# Altium footprint library ICs And Semiconductors THD.PcbLib: 292 footprints (part 8 of 19)
Each footprint in its own frame and in the unit in brackets; x right, y up, seen from the top. Pads: shape width x height; smd on the part's side, far side on the other; paste and mask are expansions set on the pad; w line width, h text height; cw(c..) or ccw(c..) is an arc to the next point about the centre after c.
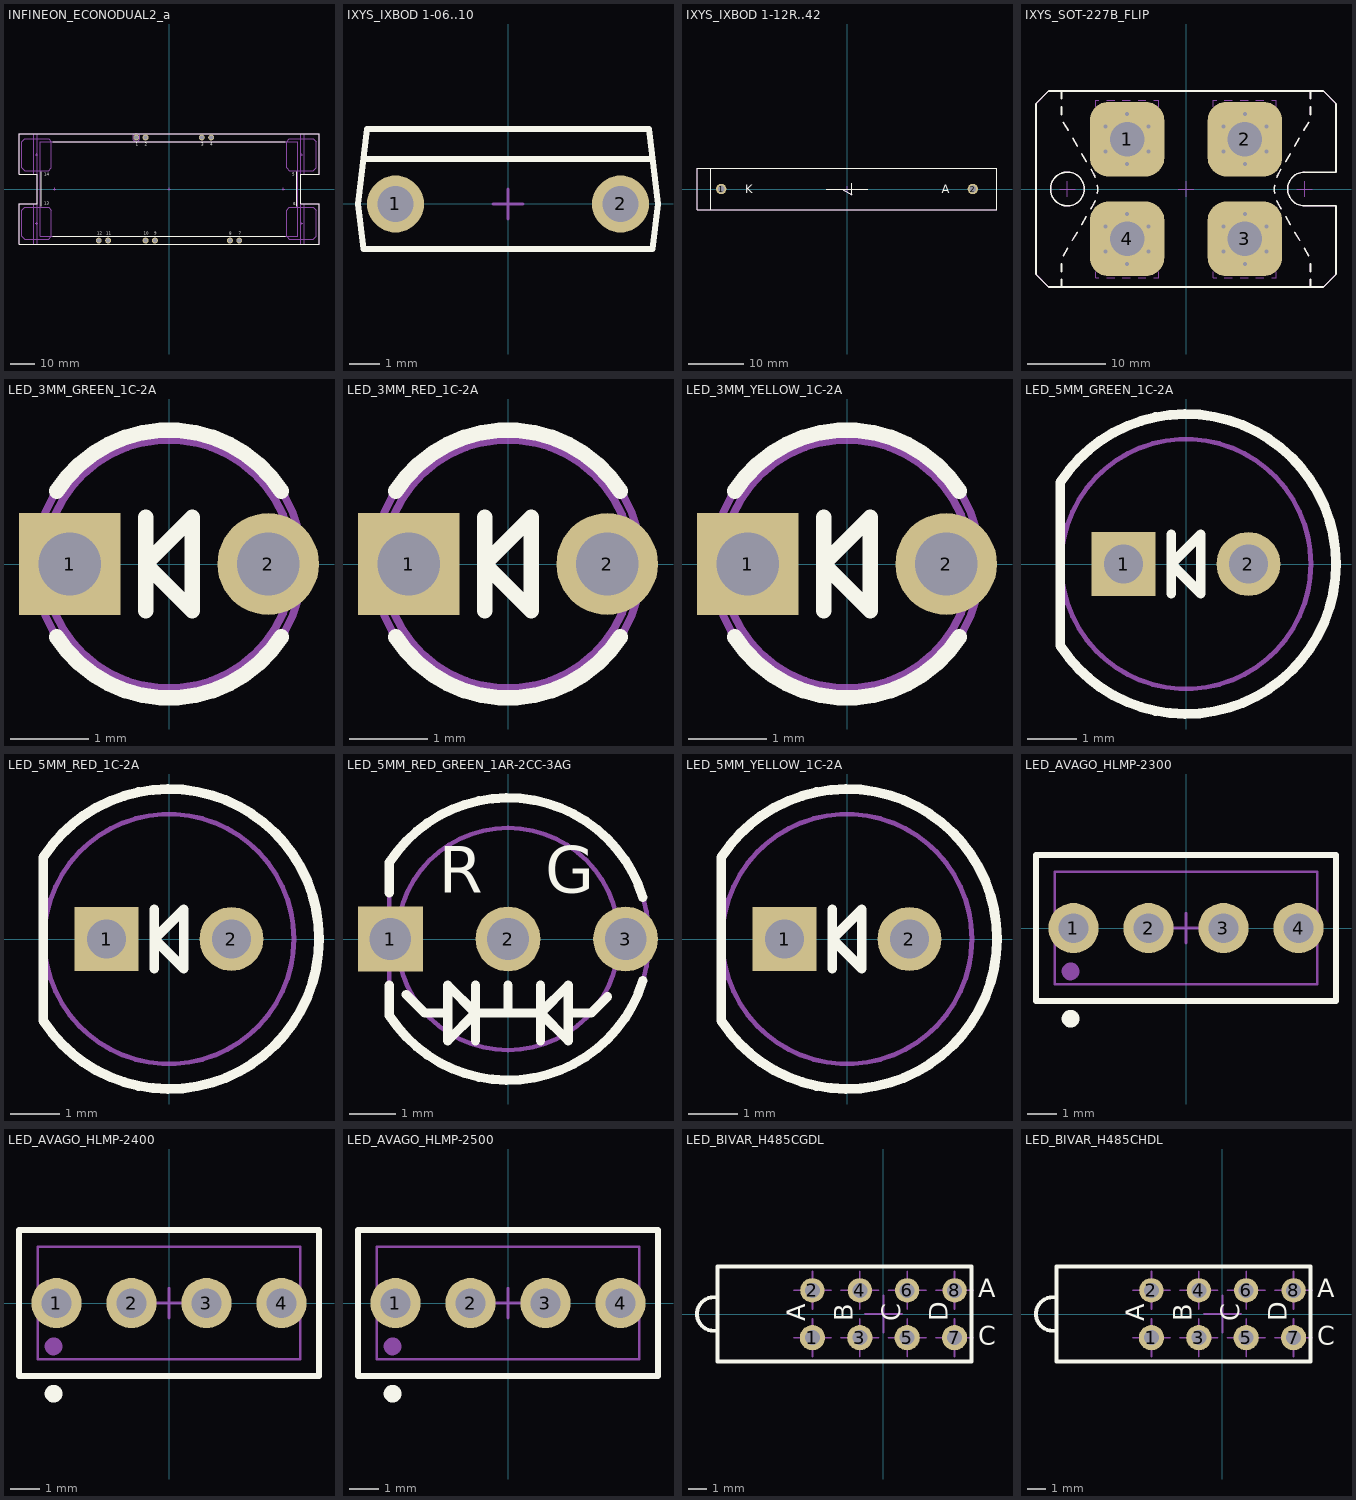
[diagram p7: the footprints below, top view; thin cyan lines are the x and y axes]

## INFINEON_ECONODUAL2_a [mm] "INFINEON EconoDUAL 2 Module"
height 17.5
pads (10):
  round 2.4 hole 1.7: 1(-13.33,20.95) 2(-9.52,20.95) 3(13.34,20.95) 4(17.15,20.95) 7(28.58,-20.95) 8(24.77,-20.95) 9(-5.71,-20.95) 10(-9.52,-20.95) 11(-24.76,-20.95) 12(-28.57,-20.95)
Top Overlay:
  lines w0.2: -52.025,-7 -52.025,7 ; -47.3,-19.15 47.3,-19.15 ; -47.3,19.15 47.3,19.15 ; 52.025,-7 52.025,7 ; -61,-22.5 -61,-6.028 -53.6,-6.028 -53.6,6.028 -61,6.028 -61,22.5 61,22.5 61,6.028 53.6,6.028 53.6,-6.028 61,-6.028 61,-22.5 -61,-22.5
  text "6" at 50.434,-6.7 h1.2
  text "5" at 50.134,5.4 h1.2
  text "14" at -50.78,5.45 h1.2
  text "13" at -50.78,-6.45 h1.2
  text "12" at -29.25,-18.6 h1.2
  text "11" at -25.44,-18.6 h1.2
  text "10" at -10.2,-18.6 h1.2
  text "9" at -5.99,-18.7 h1.2
  text "8" at 24.49,-18.7 h1.2
  text "7" at 28.3,-18.7 h1.2
  text "4" at 16.8,17.6 h1.2
  text "3" at 13.034,17.6 h1.2
  text "2" at -9.8,17.6 h1.2
  text "1" at -13.6,17.6 h1.2
Notvisible:
  circle w0.1: c-13.33,20.95 r1.5
  lines w0.1: -54.3,-14 -53.8,-14 ; -54.3,14 -53.8,14 ; -53.8,-14.5 -53.8,-14 ; -53.8,-13.5 -53.8,-14 ; -53.8,13.5 -53.8,14 ; -53.8,14.5 -53.8,14 ; -53.3,-14 -53.8,-14 ; -53.3,14 -53.8,14 ; -47,0 -46.5,0 ; -46.5,-0.5 -46.5,0 ; -46.5,0.5 -46.5,0 ; -46,0 -46.5,0 ; -29.07,-20.95 -28.57,-20.95 ; -28.57,-21.45 -28.57,-20.95 ; -28.57,-20.45 -28.57,-20.95 ; -28.07,-20.95 -28.57,-20.95 ; -25.26,-20.95 -24.76,-20.95 ; -24.76,-21.45 -24.76,-20.95 ; -24.76,-20.45 -24.76,-20.95 ; -24.26,-20.95 -24.76,-20.95 ; -13.83,20.95 -13.33,20.95 ; -13.33,20.45 -13.33,20.95 ; -13.33,21.45 -13.33,20.95 ; -12.83,20.95 -13.33,20.95 ; -10.02,-20.95 -9.52,-20.95 ; -10.02,20.95 -9.52,20.95 ; -9.52,-21.45 -9.52,-20.95 ; -9.52,-20.45 -9.52,-20.95 ; -9.52,20.45 -9.52,20.95 ; -9.52,21.45 -9.52,20.95 ; -9.02,-20.95 -9.52,-20.95 ; -9.02,20.95 -9.52,20.95 ; -6.21,-20.95 -5.71,-20.95 ; -5.71,-21.45 -5.71,-20.95 ; -5.71,-20.45 -5.71,-20.95 ; -5.21,-20.95 -5.71,-20.95 ; -0.5,0 0,0 ; 0,-0.5 0,0 ; 0,0.5 0,0 ; 0.5,0 0,0 ; 12.84,20.95 13.34,20.95 ; 13.34,20.45 13.34,20.95 ; 13.34,21.45 13.34,20.95 ; 13.84,20.95 13.34,20.95 ; 16.65,20.95 17.15,20.95 ; 17.15,20.45 17.15,20.95 ; 17.15,21.45 17.15,20.95 ; 17.65,20.95 17.15,20.95 ; 24.27,-20.95 24.77,-20.95 ; 24.77,-21.45 24.77,-20.95 ; 24.77,-20.45 24.77,-20.95 ; 25.27,-20.95 24.77,-20.95 ; 28.08,-20.95 28.58,-20.95 ; 28.58,-21.45 28.58,-20.95 ; 28.58,-20.45 28.58,-20.95 ; 29.08,-20.95 28.58,-20.95 ; 46,0 46.5,0 ; 46.5,-0.5 46.5,0 ; 46.5,0.5 46.5,0 ; 47,0 46.5,0 ; 53.3,-14 53.8,-14 ; 53.3,14 53.8,14 ; 53.8,-14.5 53.8,-14 ; 53.8,-13.5 53.8,-14 ; 53.8,13.5 53.8,14 ; 53.8,14.5 53.8,14 ; 54.3,-14 53.8,-14 ; 54.3,14 53.8,14 ; -59.8,-19.3 -58.6,-20.5 -49,-20.5 -47.8,-19.3 -47.8,-8.7 -49,-7.5 -58.6,-7.5 -59.8,-8.7 -59.8,-19.3 ; -59.8,8.7 -59.8,19.3 -58.6,20.5 -49,20.5 -47.8,19.3 -47.8,8.7 -49,7.5 -58.6,7.5 -59.8,8.7 ; 47.8,-19.3 47.8,-8.7 49,-7.5 58.6,-7.5 59.8,-8.7 59.8,-19.3 58.6,-20.5 49,-20.5 47.8,-19.3 ; 47.8,8.7 47.8,19.3 49,20.5 58.6,20.5 59.8,19.3 59.8,8.7 58.6,7.5 49,7.5 47.8,8.7
Mechanical 14:
  lines w0.1: -55.1,-22.5 -55.1,-6.028 ; -55.1,6.028 -55.1,22.5 ; -53.6,-22.5 -53.6,22.5 ; -53.6,-6.028 -61,-6.028 -61,-22.5 61,-22.5 61,-6.028 53.6,-6.028 ; -53.6,6.028 -61,6.028 -61,22.5 61,22.5 61,6.028 53.6,6.028 ; 53.6,-22.5 53.6,22.5 ; 55.1,-22.5 55.1,-6.028 ; 55.1,6.028 55.1,22.5 ; -52.4,-19.15 52.4,-19.15 52.4,19.15 -52.4,19.15 -52.4,-19.15
  text "6" at 50.434,-6.7 h1.2
  text "5" at 50.134,5.4 h1.2
  text "14" at -50.78,5.45 h1.2
  text "13" at -50.78,-6.45 h1.2
  text "12" at -29.25,-18.6 h1.2
  text "11" at -25.44,-18.6 h1.2
  text "10" at -10.2,-18.6 h1.2
  text "9" at -5.99,-18.7 h1.2
  text "8" at 24.49,-18.7 h1.2
  text "7" at 28.3,-18.7 h1.2
  text "4" at 16.8,17.6 h1.2
  text "3" at 13.034,17.6 h1.2
  text "2" at -9.8,17.6 h1.2
  text "1" at -13.6,17.6 h1.2
3D body "INFINEON_ECONODUAL2.stp": height 17, standoff -3.5, extent -61,-22.5 61,22.5

## IXYS_IXBOD 1-06..10 [mm] "Lead spacing 7.5mm Body 10mm X 4mm"
height 9
pads (2):
  round 1.9 hole 1.2: 1(-3.75,0) 2(3.75,0)
Top Overlay:
  lines w0.2: -4.816,1.5 4.816,1.5 ; -5,0 -4.816,-1.5 4.816,-1.5 5,0 4.693,2.5 -4.693,2.5 -5,0
Notvisible:
  lines w0.1: -4.25,0 -3.75,0 ; -3.75,-0.5 -3.75,0 ; -3.75,0.5 -3.75,0 ; -3.25,0 -3.75,0 ; -0.5,0 0,0 ; 0,-0.5 0,0 ; 0,0.5 0,0 ; 0.5,0 0,0 ; 3.25,0 3.75,0 ; 3.75,-0.5 3.75,0 ; 3.75,0.5 3.75,0 ; 4.25,0 3.75,0
Mechanical 14:
  lines w0.1: -4.816,1.5 4.816,1.5 ; -5,0 -4.816,-1.5 4.816,-1.5 5,0 4.693,2.5 -4.693,2.5 -5,0
3D body "IXYS_IXBOD 1-06..10.stp": height 9, standoff -4, extent -5,-1.5 5,2.5

## IXYS_IXBOD 1-12R..42 [mm] "Lead spacing 45.7mm Body 54.5mm X 7.5mm"
height 19
pads (2):
  round 1.9 hole 1.2: 1(-22.86,0) 2(22.86,0)
Top Overlay:
  lines w0.2: -24.75,-3.75 -24.75,3.75 ; -3.75,0 3.75,0 ; -0.866,0 0.866,-1 0.866,1 ; -27.25,-3.75 27.25,-3.75 27.25,3.75 -27.25,3.75 -27.25,-3.75
  text "K" at -18.454,-0.75 h1.5
  text "A" at 17.175,-0.75 h1.5
Notvisible:
  lines w0.1: -23.35,0 -22.85,0 ; -22.85,-0.5 -22.85,0 ; -22.85,0.5 -22.85,0 ; -22.35,0 -22.85,0 ; -0.5,0 0,0 ; 0,-0.5 0,0 ; 0,0.5 0,0 ; 0.5,0 0,0 ; 22.35,0 22.85,0 ; 22.85,-0.5 22.85,0 ; 22.85,0.5 22.85,0 ; 23.35,0 22.85,0
Mechanical 14:
  lines w0.1: -24.75,-3.75 -24.75,3.75 ; -3.75,0 3.75,0 ; -0.866,0 0.866,-1 0.866,1 ; -27.25,-3.75 27.25,-3.75 27.25,3.75 -27.25,3.75 -27.25,-3.75
  text "K" at -18.454,-0.75 h1.5
  text "A" at 17.175,-0.75 h1.5
3D body "IXYS_IXBOD 1-12..42.stp": height 19, standoff -3.1, extent -27.25,-3.75 27.25,3.75

## IXYS_SOT-227B_FLIP [mm] "IXYS SOT-227B (Minibloc) Case, Body 38.01mm x 25.42mm, Screws on PCB Version"
height 12.22
pads (4):
  rrect50% 9.5x9.5 hole 4.4: 1(-7.5,6.35) 2(7.5,6.35) 3(7.5,-6.35) 4(-7.5,-6.35)
via 10.25,4.763 diameter 1 hole 0.5
via 7.5,3.175 diameter 1 hole 0.5
via 4.75,4.763 diameter 1 hole 0.5
via 4.75,7.938 diameter 1 hole 0.5
via 7.5,9.525 diameter 1 hole 0.5
via 10.25,7.938 diameter 1 hole 0.5
via -4.75,4.763 diameter 1 hole 0.5
via -7.5,3.175 diameter 1 hole 0.5
via -10.25,4.763 diameter 1 hole 0.5
via -10.25,7.938 diameter 1 hole 0.5
via -7.5,9.525 diameter 1 hole 0.5
via -4.75,7.938 diameter 1 hole 0.5
via 10.25,-7.938 diameter 1 hole 0.5
via 7.5,-9.525 diameter 1 hole 0.5
via 4.75,-7.938 diameter 1 hole 0.5
via 4.75,-4.763 diameter 1 hole 0.5
via 7.5,-3.175 diameter 1 hole 0.5
via 10.25,-4.763 diameter 1 hole 0.5
via -4.75,-7.938 diameter 1 hole 0.5
via -7.5,-9.525 diameter 1 hole 0.5
via -10.25,-7.938 diameter 1 hole 0.5
via -10.25,-4.763 diameter 1 hole 0.5
via -7.5,-3.175 diameter 1 hole 0.5
via -4.75,-4.763 diameter 1 hole 0.5
Top Overlay:
  circle w0.2: c-15.1,0 r2.15
  lines w0.2: -15.85,-11.521 -15.85,-12.479 ; -15.85,-10.521 -15.85,-9.521 ; -15.85,9.479 -15.85,10.479 ; -15.85,11.479 -15.85,12.479 ; -15.628,-8.521 -15.043,-7.521 ; -15.603,8.479 -15.018,7.479 ; -14.457,-6.521 -13.871,-5.521 ; -14.432,6.479 -13.847,5.479 ; -13.286,-4.521 -12.7,-3.521 ; -13.261,4.479 -12.676,3.479 ; -12.115,-2.521 -11.778,-1.945 ccw(c-15.1,0) -11.563,-1.521 ; -12.09,2.479 -11.778,1.945 cw(c-15.1,0) -11.545,1.479 ; -11.285,-0.521 ccw(c-15.1,0) -11.28,0.479 ; 11.28,0.479 ccw(c15.1,0) 11.285,-0.521 ; 11.545,1.479 cw(c15.1,0) 11.778,1.945 12.09,2.479 ; 11.563,-1.521 ccw(c15.1,0) 11.778,-1.945 12.115,-2.521 ; 12.676,3.479 13.261,4.479 ; 12.7,-3.521 13.286,-4.521 ; 13.847,5.479 14.432,6.479 ; 13.871,-5.521 14.457,-6.521 ; 15.018,7.479 15.603,8.479 ; 15.043,-7.521 15.628,-8.521 ; 15.85,-11.521 15.85,-12.479 ; 15.85,-10.521 15.85,-9.521 ; 15.85,9.479 15.85,10.479 ; 15.85,11.479 15.85,12.479 ; -15.85,-12.479 15.85,-12.479 ; -15.85,-12.479 -17.5,-12.479 -19.1,-10.879 -19.1,10.879 -17.5,12.479 -15.85,12.479 ; -15.85,12.479 15.85,12.479 ; 15.1,-2.15 cw(c15.1,0) 15.1,2.15 ; 15.1,-2.15 19.1,-2.15 ; 15.1,-2.15 19.1,-2.15 ; 15.1,2.15 19.1,2.15 ; 15.1,2.15 19.1,2.15 ; 15.85,-12.479 17.5,-12.479 19.1,-10.879 19.1,-2.15 ; 15.85,12.479 17.5,12.479 19.1,10.879 19.1,2.15
Notvisible:
  lines w0.1: -15.1,0 -16.1,0 -15.1,0 ; -15.1,0 -14.1,0 -15.1,0 ; -15.1,0 -15.1,1 -15.1,0 ; -15.1,0 -15.1,-1 -15.1,0 ; -7.5,-6.35 -8.5,-6.35 -7.5,-6.35 ; -7.5,-6.35 -6.5,-6.35 -7.5,-6.35 ; -7.5,-6.35 -7.5,-5.35 -7.5,-6.35 ; -7.5,-6.35 -7.5,-7.35 -7.5,-6.35 ; -7.5,6.35 -8.5,6.35 -7.5,6.35 ; -7.5,6.35 -6.5,6.35 -7.5,6.35 ; -7.5,6.35 -7.5,7.35 -7.5,6.35 ; -7.5,6.35 -7.5,5.35 -7.5,6.35 ; 0,0 -1,0 0,0 ; 0,0 1,0 0,0 ; 0,0 0,1 0,0 ; 0,0 0,-1 0,0 ; 7.5,-6.35 6.5,-6.35 7.5,-6.35 ; 7.5,-6.35 8.5,-6.35 7.5,-6.35 ; 7.5,-6.35 7.5,-5.35 7.5,-6.35 ; 7.5,-6.35 7.5,-7.35 7.5,-6.35 ; 7.5,6.35 6.5,6.35 7.5,6.35 ; 7.5,6.35 8.5,6.35 7.5,6.35 ; 7.5,6.35 7.5,7.35 7.5,6.35 ; 7.5,6.35 7.5,5.35 7.5,6.35 ; 15.1,0 14.1,0 15.1,0 ; 15.1,0 16.1,0 15.1,0 ; 15.1,0 15.1,1 15.1,0 ; 15.1,0 15.1,-1 15.1,0
Mechanical 14:
  circle w0.1: c-7.5,6.35 r2.2
  circle w0.1: c7.5,6.35 r2.2
  circle w0.1: c7.5,-6.35 r2.2
  circle w0.1: c-7.5,-6.35 r2.2
  circle w0.1: c-15.1,0 r2.15
  lines w0.1: -15.85,-11.521 -15.85,-12.479 ; -15.85,-10.521 -15.85,-9.521 ; -15.85,9.479 -15.85,10.479 ; -15.85,11.479 -15.85,12.479 ; -15.628,-8.521 -15.043,-7.521 ; -15.603,8.479 -15.018,7.479 ; -14.457,-6.521 -13.871,-5.521 ; -14.432,6.479 -13.847,5.479 ; -13.286,-4.521 -12.7,-3.521 ; -13.261,4.479 -12.676,3.479 ; -12.115,-2.521 -11.778,-1.945 ccw(c-15.1,0) -11.563,-1.521 ; -12.09,2.479 -11.778,1.945 cw(c-15.1,0) -11.545,1.479 ; -11.5,-10.521 -11.5,-11.314 -11.1,-11.314 ; -11.5,-9.521 -11.5,-8.521 ; -11.5,-7.521 -11.5,-6.521 ; -11.5,-5.521 -11.5,-4.521 ; -11.5,-3.521 -11.5,-3.342 ; -11.5,3.479 -11.5,3.342 -10.637,2.479 ; -11.5,4.479 -11.5,5.479 ; -11.5,6.479 -11.5,7.479 ; -11.5,8.479 -11.5,9.479 ; -11.5,10.479 -11.5,11.314 -11.1,11.314 ; -11.285,-0.521 ccw(c-15.1,0) -11.28,0.479 ; -10.1,-11.314 -9.1,-11.314 ; -10.1,11.314 -9.1,11.314 ; -10,1.842 -9.1,1.842 ; -8.1,-11.314 -7.1,-11.314 ; -8.1,1.842 -7.1,1.842 ; -8.1,11.314 -7.1,11.314 ; -6.1,-11.314 -5.1,-11.314 ; -6.1,1.842 -5.1,1.842 ; -6.1,11.314 -5.1,11.314 ; -5.1,-1.842 -6.1,-1.842 -5,-1.842 ; -4.363,2.479 -3.5,3.342 -3.5,3.479 ; -4.1,-11.314 -3.5,-11.314 -3.5,-10.521 ; -4.1,11.314 -3.5,11.314 -3.5,10.479 ; -3.5,-9.521 -3.5,-8.521 ; -3.5,-7.521 -3.5,-6.521 ; -3.5,-5.521 -3.5,-4.521 ; -3.5,-3.521 -3.5,-3.342 ; -3.5,4.479 -3.5,5.479 ; -3.5,6.479 -3.5,7.479 ; -3.5,8.479 -3.5,9.479 ; 3.5,-10.521 3.5,-11.314 3.9,-11.314 ; 3.5,-9.521 3.5,-8.521 ; 3.5,-7.521 3.5,-6.521 ; 3.5,-5.521 3.5,-4.521 ; 3.5,-3.521 3.5,-3.342 4.321,-2.521 ; 3.5,3.479 3.5,3.342 4.363,2.479 ; 3.5,4.479 3.5,5.479 ; 3.5,6.479 3.5,7.479 ; 3.5,8.479 3.5,9.479 ; 3.5,10.479 3.5,11.314 3.9,11.314 ; 4.9,-11.314 5.9,-11.314 ; 4.9,11.314 5.9,11.314 ; 5,-1.842 5.9,-1.842 ; 5,1.842 5.9,1.842 ; 6.9,-11.314 7.9,-11.314 ; 6.9,-1.842 7.9,-1.842 ; 6.9,1.842 7.9,1.842 ; 6.9,11.314 7.9,11.314 ; 8.9,-11.314 9.9,-11.314 ; 8.9,-1.842 9.9,-1.842 ; 8.9,1.842 9.9,1.842 ; 8.9,11.314 9.9,11.314 ; 10.637,2.479 11.5,3.342 11.5,3.479 ; 10.679,-2.521 11.5,-3.342 11.5,-3.521 ; 10.9,-11.314 11.5,-11.314 11.5,-10.521 ; 10.9,11.314 11.5,11.314 11.5,10.479 ; 11.28,0.479 ccw(c15.1,0) 11.285,-0.521 ; 11.5,-9.521 11.5,-8.521 ; 11.5,-7.521 11.5,-6.521 ; 11.5,-5.521 11.5,-4.521 ; 11.5,4.479 11.5,5.479 ; 11.5,6.479 11.5,7.479 ; 11.5,8.479 11.5,9.479 ; 11.545,1.479 cw(c15.1,0) 11.778,1.945 12.09,2.479 ; 11.563,-1.521 ccw(c15.1,0) 11.778,-1.945 12.115,-2.521 ; 12.676,3.479 13.261,4.479 ; 12.7,-3.521 13.286,-4.521 ; 13.847,5.479 14.432,6.479 ; 13.871,-5.521 14.457,-6.521 ; 15.018,7.479 15.603,8.479 ; 15.043,-7.521 15.628,-8.521 ; 15.85,-11.521 15.85,-12.479 ; 15.85,-10.521 15.85,-9.521 ; 15.85,9.479 15.85,10.479 ; 15.85,11.479 15.85,12.479 ; -15.85,-12.479 -17.5,-12.479 -19.1,-10.879 -19.1,10.879 -17.5,12.479 -15.85,12.479 ; -15.85,-12.479 15.85,-12.479 ; -15.85,12.479 15.85,12.479 ; -11.5,-3.342 -10.679,-2.521 -11.5,-3.342 ; -3.5,-3.342 -4.321,-2.521 -3.5,-3.342 ; 15.1,-2.15 cw(c15.1,0) 15.1,2.15 ; 15.1,-2.15 19.1,-2.15 ; 15.1,-2.15 19.1,-2.15 ; 15.1,2.15 19.1,2.15 ; 15.1,2.15 19.1,2.15 ; 15.85,-12.479 17.5,-12.479 19.1,-10.879 19.1,-2.15 ; 15.85,12.479 17.5,12.479 19.1,10.879 19.1,2.15 ; -10,-1.842 -9.1,-1.842 -10,-1.842 ; -8.1,-1.842 -7.1,-1.842 -8.1,-1.842
3D body "IXYS_SOT-227B_FLIP_Part2.stp": height 10.24, standoff -4.69, extent -11.5,-10.365 11.5,10.365
3D body "IXYS_SOT-227B_FLIP.stp": height 12.02, standoff -4.69, extent -19.05,-12.625 19.05,12.625

## LED_3MM_GREEN_1C-2A [mm] "LED, Green, Body Dia. 3.43 mm, Pin spacing 2.54mm"
height 6.35
pads (2):
  rect 1.3x1.3 hole 0.8: 1(-1.27,0)
  round 1.3 hole 0.8: 2(1.27,0)
Top Overlay:
  lines w0.2: -1.438,-0.934 ccw(c0,0) 1.438,-0.934 ; -1.438,0.934 cw(c0,0) 1.438,0.934 ; -0.3,-0.6 -0.3,0.6 ; -0.3,0 0.3,0.6 0.3,-0.6 -0.3,0
Mechanical 14:
  circle w0.1: c0,0 r1.715
  circle w0.1: c0,0 r1.59
  lines w0.1: -0.3,-0.6 -0.3,0.6 ; -0.3,0 0.3,-0.6 0.3,0.6 -0.3,0
3D body "LED_3MM_GREEN_v.stp": height 9.85, standoff -3.5, extent -1.715,-1.715 1.715,1.715

## LED_3MM_RED_1C-2A [mm] "LED, Red, Body Dia. 3.43 mm, Pin spacing 2.54mm"
height 6.35
pads (2):
  rect 1.3x1.3 hole 0.8: 1(-1.27,0)
  round 1.3 hole 0.8: 2(1.27,0)
Top Overlay:
  lines w0.2: -1.438,-0.934 ccw(c0,0) 1.438,-0.934 ; -1.438,0.934 cw(c0,0) 1.438,0.934 ; -0.3,-0.6 -0.3,0.6 ; -0.3,0 0.3,0.6 0.3,-0.6 -0.3,0
Mechanical 14:
  circle w0.1: c0,0 r1.715
  circle w0.1: c0,0 r1.59
  lines w0.1: -0.3,-0.6 -0.3,0.6 ; -0.3,0 0.3,0.6 0.3,-0.6 -0.3,0
3D body "LED_3MM_RED_v.stp": height 9.85, standoff -3.5, extent -1.715,-1.715 1.715,1.715

## LED_3MM_YELLOW_1C-2A [mm] "LED, Red, Body Dia. 3.43 mm, Pin spacing 2.54mm"
height 6.35
pads (2):
  rect 1.3x1.3 hole 0.8: 1(-1.27,0)
  round 1.3 hole 0.8: 2(1.27,0)
Top Overlay:
  lines w0.2: -1.438,-0.934 ccw(c0,0) 1.438,-0.934 ; -1.438,0.934 cw(c0,0) 1.438,0.934 ; -0.3,-0.6 -0.3,0.6 ; -0.3,0 0.3,-0.6 0.3,0.6 -0.3,0
Mechanical 14:
  circle w0.1: c0,0 r1.59
  circle w0.1: c0,0 r1.715
  lines w0.1: -0.3,-0.6 -0.3,0.6 ; -0.3,0 0.3,-0.6 0.3,0.6 -0.3,0
3D body "LED_3MM_YELLOW_v.stp": height 9.85, standoff -3.5, extent -1.715,-1.715 1.715,1.715

## LED_5MM_GREEN_1C-2A [mm] "LED, Green, Body Dia. 5.08mm, Pin spacing 2.54mm"
height 9.19
pads (2):
  rect 1.3x1.3 hole 0.8: 1(-1.27,0)
  round 1.3 hole 0.8: 2(1.27,0)
Top Overlay:
  lines w0.2: -0.3,-0.6 -0.3,0.6 ; -2.558,-1.661 ccw(c0,0) -2.558,1.661 -2.558,-1.661 ; -0.3,0 0.3,-0.6 0.3,0.6 -0.3,0
Mechanical 14:
  circle w0.1: c0,0 r2.54
  lines w0.1: -0.3,-0.6 -0.3,0.6 ; -2.529,-1.706 ccw(c0,0) -2.529,1.706 -2.529,-1.706 ; -0.3,0 0.3,0.6 0.3,-0.6 -0.3,0
3D body "LED_5MM_GREEN_v.stp": height 14.32, standoff -3.5, extent -2.54,-3.048 3.05,3.048

## LED_5MM_RED_1C-2A [mm] "LED, Red, Body Dia. 5.08mm, Pin spacing 2.54mm"
height 9.19
pads (2):
  rect 1.3x1.3 hole 0.8: 1(-1.27,0)
  round 1.3 hole 0.8: 2(1.27,0)
Top Overlay:
  lines w0.2: -0.3,-0.6 -0.3,0.6 ; -2.558,-1.661 ccw(c0,0) -2.558,1.661 -2.558,-1.661 ; -0.3,0 0.3,-0.6 0.3,0.6 -0.3,0
Mechanical 14:
  circle w0.1: c0,0 r2.54
  lines w0.1: -0.3,-0.6 -0.3,0.6 ; -2.529,-1.706 ccw(c0,0) -2.529,1.706 -2.529,-1.706 ; -0.3,0 0.3,0.6 0.3,-0.6 -0.3,0
3D body "LED_5MM_RED_v.stp": height 14.32, standoff -3.5, extent -2.54,-3.048 3.05,3.048

## LED_5MM_RED_GREEN_1AR-2CC-3AG [mm] "Bicolor Red/Green  LED 1 Anode Red 2 Com Cathode 3 Anode Green, Body Dia. 5.08mm, Pin spacing 2.54mm"
height 12.4
pads (3):
  rect 1.4x1.4 hole 0.9: 1(-2.54,0)
  round 1.4 hole 0.9: 2(0,0) 3(2.54,0)
Top Overlay:
  lines w0.2: -2.563,-1 -2.563,-1.653 ccw(c0,0) 2.913,-0.904 ; -2.563,1 -2.563,1.653 cw(c0,0) 2.913,0.904 ; -2.2,-1.2 -1.8,-1.6 -1.3,-1.6 ; -0.7,-2.2 -0.7,-1 ; 0,-1.6 0,-1 ; 0.7,-2.2 0.7,-1 ; 1.3,-1.6 1.8,-1.6 2.15,-1.25 ; -0.7,-1.6 0.7,-1.6 ; -0.7,-1.6 -1.3,-1 -1.3,-2.2 -0.7,-1.6 ; 0.7,-1.6 1.3,-2.2 1.3,-1 0.7,-1.6
  text "G" at 0.8,1 h1
  text "R" at -1.5,1 h1
Mechanical 14:
  lines w0.1: -1.8,-1.6 -1.3,-1.6 ; -0.7,-2.2 -0.7,-1 ; 0,-1.6 0,-1 ; 0.7,-2.2 0.7,-1 ; 1.3,-1.6 1.8,-1.6 ; -0.7,-1.6 -1.3,-2.2 -1.3,-1 -0.7,-1.6 ; -0.7,-1.6 0.7,-1.6 ; 0.7,-1.6 1.3,-1 1.3,-2.2 0.7,-1.6 ; -2.563,-1.653 ccw(c0,0) 3.05,0 ccw(c0,0) -2.563,1.653 -2.563,0 -2.563,-1.653 ; -2.4,0 ccw(c0,0) 2.4,0 ccw(c0,0) -2.4,0
3D body "LED_OSRAM_LU5351-JM-1.stp": height 12.4, standoff -3.6, extent -2.94,-2.95 2.95,2.95

## LED_5MM_YELLOW_1C-2A [mm] "LED, Yellow, Body Dia. 5.08mm, Pin spacing 2.54mm"
height 9.19
pads (2):
  rect 1.3x1.3 hole 0.8: 1(-1.27,0)
  round 1.3 hole 0.8: 2(1.27,0)
Top Overlay:
  lines w0.2: -0.3,-0.6 -0.3,0.6 ; -2.558,-1.661 ccw(c0,0) -2.558,1.661 -2.558,-1.661 ; -0.3,0 0.3,0.6 0.3,-0.6 -0.3,0
Mechanical 14:
  circle w0.1: c0,0 r2.54
  lines w0.1: -0.3,-0.6 -0.3,0.6 ; -2.529,-1.706 ccw(c0,0) -2.529,1.706 -2.529,-1.706 ; -0.3,0 0.3,0.6 0.3,-0.6 -0.3,0
3D body "LED_5MM_YELLOW_v.stp": height 14.32, standoff -3.5, extent -2.54,-3.048 3.05,3.048

## LED_AVAGO_HLMP-2300 [mm] "10.16x 4.953mm HER LED Bar Module (2 LEDs)"
height 6.22
pads (4):
  round 1.7 hole 1: 1(-3.81,0) 2(-1.27,0) 3(1.27,0) 4(3.81,0)
Top Overlay:
  circle w0.3: c-3.91,-3.07 r0.15
  lines w0.2: -5.08,-2.477 5.08,-2.477 5.08,2.477 -5.08,2.477 -5.08,-2.477
Notvisible:
  lines w0.1: -4.31,0 -3.81,0 ; -3.81,-0.5 -3.81,0 ; -3.81,0.5 -3.81,0 ; -3.31,0 -3.81,0 ; -1.77,0 -1.27,0 ; -1.27,-0.5 -1.27,0 ; -1.27,0.5 -1.27,0 ; -0.77,0 -1.27,0 ; -0.5,0 0,0 ; 0,-0.5 0,0 ; 0,0.5 0,0 ; 0.5,0 0,0 ; 0.77,0 1.27,0 ; 1.27,-0.5 1.27,0 ; 1.27,0.5 1.27,0 ; 1.77,0 1.27,0 ; 3.31,0 3.81,0 ; 3.81,-0.5 3.81,0 ; 3.81,0.5 3.81,0 ; 4.31,0 3.81,0
Mechanical 14:
  circle w0.3: c-3.91,-1.47 r0.15
  lines w0.1: -4.445,-1.905 4.445,-1.905 ; -4.445,-1.905 -4.445,1.905 ; -4.445,-1.905 4.445,-1.905 ; -4.445,-1.905 -4.445,1.905 ; -4.445,1.905 4.445,1.905 ; -4.445,1.905 4.445,1.905 ; 4.445,-1.905 4.445,1.905 ; 4.445,-1.905 4.445,1.905 ; -5.08,-2.477 5.08,-2.477 5.08,2.477 -5.08,2.477 -5.08,-2.477
3D body "LED_AVAGO_HLMP-2300.stp": height 6.22, standoff -3.18, extent -5.08,-2.476 5.08,2.477

## LED_AVAGO_HLMP-2400 [mm] "10.16x 4.953mm Yellow LED Bar Module (2 LEDs)"
height 6.22
pads (4):
  round 1.7 hole 1: 1(-3.81,0) 2(-1.27,0) 3(1.27,0) 4(3.81,0)
Top Overlay:
  circle w0.3: c-3.91,-3.07 r0.15
  lines w0.2: -5.08,-2.477 5.08,-2.477 5.08,2.477 -5.08,2.477 -5.08,-2.477
Notvisible:
  lines w0.1: -4.31,0 -3.81,0 ; -3.81,-0.5 -3.81,0 ; -3.81,0.5 -3.81,0 ; -3.31,0 -3.81,0 ; -1.77,0 -1.27,0 ; -1.27,-0.5 -1.27,0 ; -1.27,0.5 -1.27,0 ; -0.77,0 -1.27,0 ; -0.5,0 0,0 ; 0,-0.5 0,0 ; 0,0.5 0,0 ; 0.5,0 0,0 ; 0.77,0 1.27,0 ; 1.27,-0.5 1.27,0 ; 1.27,0.5 1.27,0 ; 1.77,0 1.27,0 ; 3.31,0 3.81,0 ; 3.81,-0.5 3.81,0 ; 3.81,0.5 3.81,0 ; 4.31,0 3.81,0
Mechanical 14:
  circle w0.3: c-3.91,-1.47 r0.15
  lines w0.1: -4.445,-1.905 4.445,-1.905 ; -4.445,-1.905 -4.445,1.905 ; -4.445,-1.905 4.445,-1.905 ; -4.445,-1.905 -4.445,1.905 ; -4.445,1.905 4.445,1.905 ; -4.445,1.905 4.445,1.905 ; 4.445,-1.905 4.445,1.905 ; 4.445,-1.905 4.445,1.905 ; -5.08,-2.477 5.08,-2.477 5.08,2.477 -5.08,2.477 -5.08,-2.477
3D body "LED_AVAGO_HLMP-2400.stp": height 6.22, standoff -3.18, extent -5.08,-2.476 5.08,2.477

## LED_AVAGO_HLMP-2500 [mm] "10.16x 4.953mm Green LED Bar Module (2 LEDs)"
height 6.22
pads (4):
  round 1.7 hole 1: 1(-3.81,0) 2(-1.27,0) 3(1.27,0) 4(3.81,0)
Top Overlay:
  circle w0.3: c-3.91,-3.07 r0.15
  lines w0.2: -5.08,-2.477 5.08,-2.477 5.08,2.477 -5.08,2.477 -5.08,-2.477
Notvisible:
  lines w0.1: -4.31,0 -3.81,0 ; -3.81,-0.5 -3.81,0 ; -3.81,0.5 -3.81,0 ; -3.31,0 -3.81,0 ; -1.77,0 -1.27,0 ; -1.27,-0.5 -1.27,0 ; -1.27,0.5 -1.27,0 ; -0.77,0 -1.27,0 ; -0.5,0 0,0 ; 0,-0.5 0,0 ; 0,0.5 0,0 ; 0.5,0 0,0 ; 0.77,0 1.27,0 ; 1.27,-0.5 1.27,0 ; 1.27,0.5 1.27,0 ; 1.77,0 1.27,0 ; 3.31,0 3.81,0 ; 3.81,-0.5 3.81,0 ; 3.81,0.5 3.81,0 ; 4.31,0 3.81,0
Mechanical 14:
  circle w0.3: c-3.91,-1.47 r0.15
  lines w0.1: -4.445,-1.905 4.445,-1.905 ; -4.445,-1.905 -4.445,1.905 ; -4.445,-1.905 4.445,-1.905 ; -4.445,-1.905 -4.445,1.905 ; -4.445,1.905 4.445,1.905 ; -4.445,1.905 4.445,1.905 ; 4.445,-1.905 4.445,1.905 ; 4.445,-1.905 4.445,1.905 ; -5.08,-2.477 5.08,-2.477 5.08,2.477 -5.08,2.477 -5.08,-2.477
3D body "LED_AVAGO_HLMP-2500.stp": height 6.22, standoff -3.18, extent -5.08,-2.476 5.08,2.477

## LED_BIVAR_H485CGDL [mm] "Quad-Level 2mm Green, PCB Edge Mounting  BIVAR H485CGDL"
height 11.3
pads (8):
  round 1.35 hole 0.8: 1(-3.81,-1.27) 3(-1.27,-1.27) 5(1.27,-1.27) 7(3.81,-1.27)
  round 1.3 hole 0.8: 2(-3.81,1.27) 4(-1.27,1.27) 6(1.27,1.27) 8(3.81,1.27)
Top Overlay:
  lines w0.2: -8.89,-0.9 -9.09,-0.9 cw(c-9.09,0) -9.09,0.9 -8.89,0.9 ; -8.89,-2.55 4.71,-2.55 4.71,2.55 -8.89,2.55 -8.89,-2.55
  text "C" at 5.08,-1.651 h1
  text "A" at 5.08,0.889 h1
  text "A" at -4.191,-0.381 h1
  text "B" at -1.651,-0.381 h1
  text "C" at 0.889,-0.381 h1
  text "D" at 3.429,-0.381 h1
Notvisible:
  lines w0.1: -4.81,-1.27 -3.81,-1.27 ; -4.81,1.27 -3.81,1.27 ; -3.81,-2.27 -3.81,-1.27 ; -3.81,-0.27 -3.81,-1.27 ; -3.81,0.27 -3.81,1.27 ; -3.81,2.27 -3.81,1.27 ; -2.81,-1.27 -3.81,-1.27 ; -2.81,1.27 -3.81,1.27 ; -2.27,-1.27 -1.27,-1.27 ; -2.27,1.27 -1.27,1.27 ; -1.27,-2.27 -1.27,-1.27 ; -1.27,-0.27 -1.27,-1.27 ; -1.27,0.27 -1.27,1.27 ; -1.27,2.27 -1.27,1.27 ; -1,0 0,0 ; -0.27,-1.27 -1.27,-1.27 ; -0.27,1.27 -1.27,1.27 ; 0,-1 0,0 ; 0,1 0,0 ; 0.27,-1.27 1.27,-1.27 ; 0.27,1.27 1.27,1.27 ; 1,0 0,0 ; 1.27,-2.27 1.27,-1.27 ; 1.27,-0.27 1.27,-1.27 ; 1.27,0.27 1.27,1.27 ; 1.27,2.27 1.27,1.27 ; 2.27,-1.27 1.27,-1.27 ; 2.27,1.27 1.27,1.27 ; 2.81,-1.27 3.81,-1.27 ; 2.81,1.27 3.81,1.27 ; 3.81,-2.27 3.81,-1.27 ; 3.81,-0.27 3.81,-1.27 ; 3.81,0.27 3.81,1.27 ; 3.81,2.27 3.81,1.27 ; 4.81,-1.27 3.81,-1.27 ; 4.81,1.27 3.81,1.27
Mechanical 14:
  lines w0.1: -8.89,-0.9 -9.09,-0.9 cw(c-9.09,0) -9.09,0.9 -8.89,0.9 ; -8.89,-2.55 4.71,-2.55 4.71,2.55 -8.89,2.55 -8.89,-2.55
  text "A" at 5.08,0.889 h1
  text "C" at 5.08,-1.651 h1
  text "A" at -4.191,-0.381 h1
  text "B" at -1.651,-0.381 h1
  text "C" at 0.889,-0.381 h1
  text "D" at 3.429,-0.381 h1
3D body "LED_BIVAR_H485CGDL.stp": height 11.3, standoff -3.2, extent -9.99,-2.55 4.71,2.55

## LED_BIVAR_H485CHDL [mm] "Quad-Level 2mm HE Red, PCB Edge Mounting  BIVAR H485CHDL"
height 11.3
pads (8):
  round 1.35 hole 0.8: 1(-3.81,-1.27) 3(-1.27,-1.27) 5(1.27,-1.27) 7(3.81,-1.27)
  round 1.3 hole 0.8: 2(-3.81,1.27) 4(-1.27,1.27) 6(1.27,1.27) 8(3.81,1.27)
Top Overlay:
  lines w0.2: -8.89,-0.9 -9.09,-0.9 cw(c-9.09,0) -9.09,0.9 -8.89,0.9 ; -8.89,-2.55 -8.89,2.55 4.71,2.55 4.71,-2.55 -8.89,-2.55
  text "D" at 3.429,-0.381 h1
  text "C" at 0.889,-0.381 h1
  text "B" at -1.651,-0.381 h1
  text "A" at -4.191,-0.381 h1
  text "A" at 5.08,0.889 h1
  text "C" at 5.08,-1.651 h1
Notvisible:
  lines w0.1: -4.81,-1.27 -3.81,-1.27 ; -4.81,1.27 -3.81,1.27 ; -3.81,-2.27 -3.81,-1.27 ; -3.81,-0.27 -3.81,-1.27 ; -3.81,0.27 -3.81,1.27 ; -3.81,2.27 -3.81,1.27 ; -2.81,-1.27 -3.81,-1.27 ; -2.81,1.27 -3.81,1.27 ; -2.27,-1.27 -1.27,-1.27 ; -2.27,1.27 -1.27,1.27 ; -1.27,-2.27 -1.27,-1.27 ; -1.27,-0.27 -1.27,-1.27 ; -1.27,0.27 -1.27,1.27 ; -1.27,2.27 -1.27,1.27 ; -1,0 0,0 ; -0.27,-1.27 -1.27,-1.27 ; -0.27,1.27 -1.27,1.27 ; 0,-1 0,0 ; 0,1 0,0 ; 0.27,-1.27 1.27,-1.27 ; 0.27,1.27 1.27,1.27 ; 1,0 0,0 ; 1.27,-2.27 1.27,-1.27 ; 1.27,-0.27 1.27,-1.27 ; 1.27,0.27 1.27,1.27 ; 1.27,2.27 1.27,1.27 ; 2.27,-1.27 1.27,-1.27 ; 2.27,1.27 1.27,1.27 ; 2.81,-1.27 3.81,-1.27 ; 2.81,1.27 3.81,1.27 ; 3.81,-2.27 3.81,-1.27 ; 3.81,-0.27 3.81,-1.27 ; 3.81,0.27 3.81,1.27 ; 3.81,2.27 3.81,1.27 ; 4.81,-1.27 3.81,-1.27 ; 4.81,1.27 3.81,1.27
Mechanical 14:
  lines w0.1: -8.89,-0.9 -9.09,-0.9 cw(c-9.09,0) -9.09,0.9 -8.89,0.9 ; -8.89,-2.55 -8.89,2.55 4.71,2.55 4.71,-2.55 -8.89,-2.55
  text "D" at 3.429,-0.381 h1
  text "C" at 0.889,-0.381 h1
  text "B" at -1.651,-0.381 h1
  text "A" at -4.191,-0.381 h1
  text "C" at 5.08,-1.651 h1
  text "A" at 5.08,0.889 h1
3D body "LED_BIVAR_H485CHDL.stp": height 11.3, standoff -3.2, extent -9.99,-2.55 4.71,2.55